# Altium footprint library ZJUDancer_Circuit_V4.1.PcbLib: 96 footprints (part 1 of 6)
Each footprint in its own frame and in the unit in brackets; x right, y up, seen from the top. Pads: shape width x height; smd on the part's side, far side on the other; paste and mask are expansions set on the pad; w line width, h text height; cw(c..) or ccw(c..) is an arc to the next point about the centre after c.
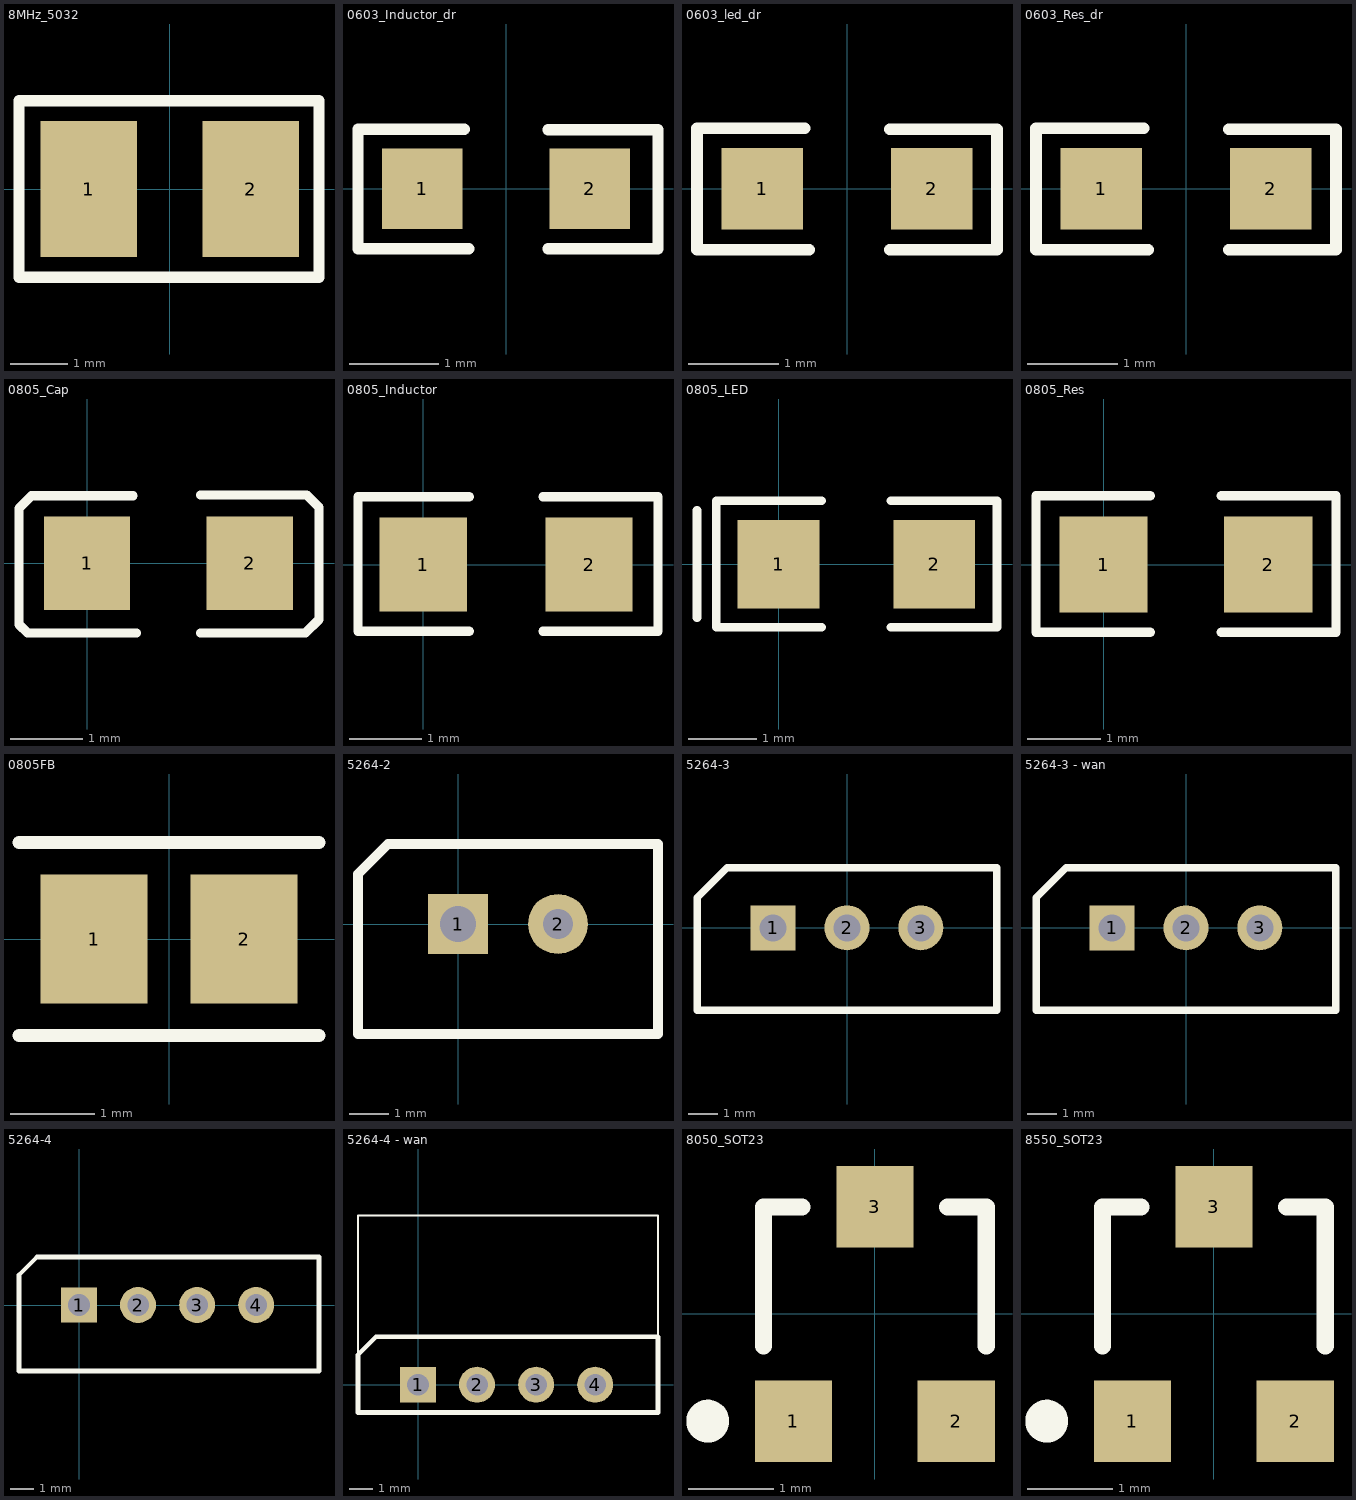
[diagram p0: the footprints below, top view; thin cyan lines are the x and y axes]

## 8MHz_5032 [mm]
height 2
pads (2):
  rect 1.7x2.4 smd: 1(-1.425,0) 2(1.425,0)
Top Overlay:
  lines w0.2: -2.65,-1.55 2.625,-1.55 2.625,1.55 -2.65,1.55 -2.65,-1.55

## 0603_Inductor_dr [mm]
height 1
pads (2):
  rect 0.9x0.9 smd: 1(-0.936,0) 2(0.936,0)
Top Overlay:
  lines w0.127: -0.466,0.668 -1.656,0.668 -1.656,-0.67 -0.416,-0.67 ; 0.47,-0.67 1.7,-0.67 1.7,0.66 0.47,0.66
3D body: height 0.39, standoff 0.02, extent -0.81,-0.4 0.81,0.4

## 0603_led_dr [mm]
height 1
pads (2):
  rect 0.9x0.9 smd: 1(-0.936,0) 2(0.936,0)
Top Overlay:
  lines w0.127: -0.466,0.668 -1.656,0.668 -1.656,-0.67 -0.416,-0.67 ; 0.47,-0.67 1.654,-0.67 1.654,0.66 0.47,0.66
3D body: height 0.39, standoff 0.02, extent -0.81,-0.4 0.81,0.4

## 0603_Res_dr [mm]
height 1
pads (2):
  rect 0.9x0.9 smd: 1(-0.936,0) 2(0.936,0)
Top Overlay:
  lines w0.127: -0.466,0.668 -1.656,0.668 -1.656,-0.67 -0.416,-0.67 ; 0.47,-0.67 1.654,-0.67 1.654,0.66 0.47,0.66
3D body: height 0.39, standoff 0.02, extent -0.81,-0.4 0.81,0.4

## 0805_Cap [mm]
height 1
pads (2):
  rect 1.2x1.3 smd: 1(0,0) 2(2.262,0)
Top Overlay:
  lines w0.127: 0.64,0.938 -0.772,0.938 -0.946,0.764 -0.946,-0.85 -0.826,-0.97 0.69,-0.97 ; 1.576,-0.97 3.037,-0.97 3.226,-0.781 3.226,0.78 3.055,0.95 1.576,0.95
3D body: height 0.74, standoff 0, extent 0.113,-0.62 2.183,0.62

## 0805_Inductor [mm] "0805贴片电感"
height 1
pads (2):
  rect 1.2x1.3 smd: 1(0,0) 2(2.286,0)
Top Overlay:
  lines w0.127: 0.635,-0.919 -0.899,-0.919 -0.899,0.935 0.635,0.935 ; 1.651,-0.919 3.236,-0.919 3.236,0.935 1.651,0.935
3D body: height 0.54, standoff 0.02, extent 0.1,-0.592 2.12,0.608

## 0805_LED [mm]
height 1
pads (2):
  rect 1.2x1.3 smd: 1(0,0) 2(2.286,0)
Top Overlay:
  lines w0.127: -1.199,-0.786 -1.199,0.794 ; 0.635,-0.927 -0.914,-0.927 -0.914,0.935 0.635,0.935 ; 1.651,-0.927 3.211,-0.927 3.211,0.935 1.651,0.935
3D body: height 1.13, standoff 0.02, extent 0.109,-0.637 2.141,0.633

## 0805_Res [mm]
height 1
pads (2):
  rect 1.2x1.3 smd: 1(0,0) 2(2.235,0)
Top Overlay:
  lines w0.127: 0.635,-0.917 -0.917,-0.917 -0.917,0.932 0.635,0.932 ; 1.6,-0.917 3.157,-0.917 3.157,0.932 1.6,0.932
3D body: height 0.54, standoff 0.02, extent 0.069,-0.609 2.089,0.591

## 0805FB [mil]
height 39.37
pads (2):
  rect 50x60 smd: 1(-35,0) 2(35,0)
Top Overlay:
  lines w6: -70,-45 70,-45 ; -70,45 70,45

## 5264-2 [mil]
pads (2):
  rect 60x60 hole 36: 1(0,0)
  round 60 hole 30: 2(100,0)
Top Overlay:
  lines w10: -100,-110 200,-110 200,80 -70,80 -100,50 -100,-110

## 5264-3 [mil]
pads (3):
  rect 60x60 hole 36: 1(-98.43,0)
  round 60 hole 36: 2(0,0) 3(98.43,0)
Top Overlay:
  lines w10: -200,-110 200,-110 200,80 -160,80 -200,40 -200,-110
3D body: height 246.06, standoff -78.74, extent -194.88,-118.11 198.82,78.74

## 5264-3 - wan [mil]
pads (3):
  rect 60x60 hole 36: 1(-98.43,0)
  round 60 hole 36: 2(0,0) 3(98.43,0)
Top Overlay:
  lines w10: -200,-110 200,-110 200,80 -160,80 -200,40 -200,-110
3D body: height 197.45, standoff -137.2, extent -198.79,-13.78 194.91,277.57

## 5264-4 [mil]
pads (4):
  rect 60x59.05 hole 36: 1(0,0)
  round 60 hole 36: 2(98.43,0) 3(196.85,0) 4(295.28,0)
Top Overlay:
  lines w7.87: -100,-110 400,-110 400,80 -70,80 -100,50 -100,-110
3D body: height 246.06, standoff -78.74, extent -97.09,-117.76 395.04,79.09

## 5264-4 - wan [mil]
pads (4):
  rect 60x59.05 hole 36: 1(0,0)
  round 60 hole 36: 2(98.43,0) 3(196.85,0) 4(295.28,0)
Top Overlay:
  lines w3.94: -100,50 -100,281.89 400,281.89 400,80
  lines w7.87: -100,-46.26 -100,50 -70,80 400,80 400,-46.26 -100,-46.26
3D body: height 197.45, standoff -78.14, extent -101.38,-15.75 390.75,283.27

## 8050_SOT23 [mm]
pads (3):
  rect 0.9x0.95 smd: 1(-0.95,-1.25) 2(0.95,-1.25) 3(0,1.25)
Top Overlay:
  circle w0.25: c-1.95,-1.25 r0.125
  lines w0.2: -1.3,-0.375 -1.3,1.25 -0.85,1.25 ; 0.85,1.25 1.3,1.25 1.3,-0.375
3D body: height 1.2, standoff 0, extent -1.45,-1.475 1.45,1.325

## 8550_SOT23 [mm]
pads (3):
  rect 0.9x0.95 smd: 1(-0.95,-1.25) 2(0.95,-1.25) 3(0,1.25)
Top Overlay:
  circle w0.25: c-1.95,-1.25 r0.125
  lines w0.2: -1.3,-0.375 -1.3,1.25 -0.85,1.25 ; 0.85,1.25 1.3,1.25 1.3,-0.375
3D body: height 1.2, standoff 0, extent -1.45,-1.475 1.45,1.325